# Altium footprint library eLIB.PcbLib: 206 footprints (part 12 of 13) (continued)
## Unalink Logo [mm] (continued)
; -1.187,3.507 1.709,3.507 ; -1.187,3.533 1.709,3.533 ; -1.161,-6.475 -0.882,-6.475 ; -1.161,-2.843 1.734,-2.843 ; -1.161,-2.817 1.734,-2.817 ; -1.161,3.558 1.734,3.558 ; -1.161,3.584 1.734,3.584 ; -1.136,-6.551 -0.857,-6.551 ; -1.136,-6.526 -0.882,-6.526 ; -1.136,-6.5 -0.882,-6.5 ; -1.136,-2.792 1.76,-2.792 ; -1.136,-2.766 1.76,-2.766 ; -1.136,3.609 1.76,3.609 ; -1.136,3.634 1.76,3.634 ; -1.111,-6.627 -0.831,-6.627 ; -1.111,-6.602 -0.857,-6.602 ; -1.111,-6.576 -0.857,-6.576 ; -1.111,-2.741 1.785,-2.741 ; -1.111,-2.716 1.785,-2.716 ; -1.111,3.66 1.785,3.66 ; -1.111,3.685 1.785,3.685 ; -1.085,-6.703 -0.806,-6.703 ; -1.085,-6.678 -0.806,-6.678 ; -1.085,-6.653 -0.831,-6.653 ; -1.085,-2.69 1.81,-2.69 ; -1.085,-2.665 1.81,-2.665 ; -1.085,3.711 1.81,3.711 ; -1.085,3.736 1.81,3.736 ; -1.06,-6.78 -0.78,-6.78 ; -1.06,-6.754 -0.78,-6.754 ; -1.06,-6.729 -0.806,-6.729 ; -1.06,-2.639 1.836,-2.639 ; -1.06,-2.614 1.836,-2.614 ; -1.06,3.761 1.836,3.761 ; -1.06,3.787 1.836,3.787 ; -1.034,-6.805 -0.78,-6.805 ; -1.034,-2.589 1.861,-2.589 ; -1.034,-2.563 1.861,-2.563 ; -1.034,3.812 1.861,3.812 ; -1.034,3.838 1.861,3.838 ; -1.009,-2.538 1.887,-2.538 ; -1.009,-2.512 1.887,-2.512 ; -1.009,3.863 1.887,3.863 ; -1.009,3.888 1.887,3.888 ; -0.984,-2.487 1.912,-2.487 ; -0.984,-2.462 1.912,-2.462 ; -0.984,3.914 1.912,3.914 ; -0.984,3.939 1.912,3.939 ; -0.958,-2.436 1.937,-2.436 ; -0.958,-2.411 1.937,-2.411 ; -0.933,-2.385 1.963,-2.385 ; -0.933,-2.36 1.963,-2.36 ; -0.907,-2.335 1.988,-2.335 ; -0.907,-2.309 1.988,-2.309 ; -0.882,-2.284 2.014,-2.284 ; -0.882,-2.258 2.014,-2.258 ; -0.857,-2.233 2.039,-2.233 ; -0.857,-2.208 2.039,-2.208 ; -0.831,-2.182 2.064,-2.182 ; -0.831,-2.157 2.064,-2.157 ; -0.806,-2.131 2.09,-2.131 ; -0.806,-2.106 2.09,-2.106 ; -0.78,-2.081 2.115,-2.081 ; -0.78,-2.055 2.115,-2.055 ; -0.755,-2.03 2.141,-2.03 ; -0.755,-2.004 2.141,-2.004 ; -0.73,-1.979 2.166,-1.979 ; -0.73,-1.954 2.166,-1.954 ; -0.704,-1.928 2.191,-1.928 ; -0.704,-1.903 2.191,-1.903 ; -0.679,-1.877 2.217,-1.877 ; -0.679,-1.852 2.217,-1.852 ; -0.653,-1.827 2.242,-1.827 ; -0.653,-1.801 2.242,-1.801 ; -0.628,-1.776 2.268,-1.776 ; -0.628,-1.75 2.268,-1.75 ; -0.603,-1.725 2.293,-1.725 ; -0.603,-1.7 2.293,-1.7 ; -0.577,-1.674 2.318,-1.674 ; -0.577,-1.649 2.318,-1.649 ; -0.552,-1.623 2.344,-1.623 ; -0.552,-1.598 2.344,-1.598 ; -0.526,-1.573 2.369,-1.573 ; -0.526,-1.547 2.369,-1.547 ; -0.501,-1.522 2.395,-1.522 ; -0.501,-1.496 2.395,-1.496 ; -0.476,-1.471 2.42,-1.471 ; -0.476,-1.446 2.42,-1.446 ; -0.45,-1.42 2.445,-1.42 ; -0.45,-1.395 2.445,-1.395 ; -0.425,-1.369 2.445,-1.369 ; -0.425,-1.344 2.471,-1.344 ; -0.399,-1.319 2.471,-1.319 ; -0.399,-1.293 2.496,-1.293 ; -0.374,-6.805 0.49,-6.805 ; -0.374,-6.78 0.49,-6.78 ; -0.374,-6.754 0.49,-6.754 ; -0.374,-6.729 0.49,-6.729 ; -0.374,-6.703 0.49,-6.703 ; -0.374,-6.678 0.49,-6.678 ; -0.374,-6.653 0.49,-6.653 ; -0.374,-6.627 0.49,-6.627 ; -0.374,-6.602 -0.12,-6.602 ; -0.374,-6.576 -0.12,-6.576 ; -0.374,-6.551 -0.12,-6.551 ; -0.374,-6.526 -0.12,-6.526 ; -0.374,-6.5 -0.12,-6.5 ; -0.374,-6.475 -0.12,-6.475 ; -0.374,-6.449 -0.12,-6.449 ; -0.374,-6.424 -0.12,-6.424 ; -0.374,-6.399 -0.12,-6.399 ; -0.374,-6.373 -0.12,-6.373 ; -0.374,-6.348 -0.12,-6.348 ; -0.374,-6.322 -0.12,-6.322 ; -0.374,-6.297 -0.12,-6.297 ; -0.374,-6.272 -0.12,-6.272 ; -0.374,-6.246 -0.12,-6.246 ; -0.374,-6.221 -0.12,-6.221 ; -0.374,-6.195 -0.12,-6.195 ; -0.374,-6.17 -0.12,-6.17 ; -0.374,-6.145 -0.12,-6.145 ; -0.374,-6.119 -0.12,-6.119 ; -0.374,-6.094 -0.12,-6.094 ; -0.374,-6.068 -0.12,-6.068 ; -0.374,-6.043 -0.12,-6.043 ; -0.374,-6.018 -0.12,-6.018 ; -0.374,-5.992 -0.12,-5.992 ; -0.374,-5.967 -0.12,-5.967 ; -0.374,-5.941 -0.12,-5.941 ; -0.374,-5.916 -0.12,-5.916 ; -0.374,-5.891 -0.12,-5.891 ; -0.374,-5.865 -0.12,-5.865 ; -0.374,-5.84 -0.12,-5.84 ; -0.374,-5.814 -0.12,-5.814 ; -0.374,-5.789 -0.12,-5.789 ; -0.374,-5.764 -0.12,-5.764 ; -0.374,-5.738 -0.12,-5.738 ; -0.374,-5.713 -0.12,-5.713 ; -0.374,-5.687 -0.12,-5.687 ; -0.374,-5.662 -0.12,-5.662 ; -0.374,-5.637 -0.12,-5.637 ; -0.374,-1.268 2.496,-1.268 ; -0.374,-1.242 2.522,-1.242 ; -0.349,-1.217 2.522,-1.217 ; -0.349,-1.192 2.547,-1.192 ; -0.323,-1.166 2.547,-1.166 ; -0.323,-1.141 2.572,-1.141 ; -0.298,-1.115 2.572,-1.115 ; -0.298,-1.09 2.598,-1.09 ; -0.272,-1.065 2.598,-1.065 ; -0.272,-1.039 2.623,-1.039 ; -0.247,-1.014 2.623,-1.014 ; -0.247,-0.988 2.649,-0.988 ; -0.222,-0.963 2.649,-0.963 ; -0.222,-0.938 2.674,-0.938 ; -0.196,-0.912 2.674,-0.912 ; -0.196,-0.887 2.699,-0.887 ; -0.171,-0.861 2.699,-0.861 ; -0.171,-0.836 2.725,-0.836 ; -0.145,-0.811 2.725,-0.811 ; -0.145,-0.785 2.75,-0.785 ; -0.12,-0.76 2.75,-0.76 ; -0.12,-0.734 2.776,-0.734 ; -0.095,-0.709 2.776,-0.709 ; -0.095,-0.684 2.801,-0.684 ; -0.069,-0.658 2.801,-0.658 ; -0.069,-0.633 2.826,-0.633 ; -0.044,-0.607 2.826,-0.607 ; -0.044,-0.582 2.852,-0.582 ; -0.018,-0.557 2.852,-0.557 ; -0.018,-0.531 2.877,-0.531 ; 0.007,-0.506 2.877,-0.506 ; 0.007,-0.48 2.903,-0.48 ; 0.032,-0.455 2.903,-0.455 ; 0.032,-0.43 2.928,-0.43 ; 0.058,-0.404 2.928,-0.404 ; 0.058,-0.379 2.953,-0.379 ; 0.083,-0.353 2.953,-0.353 ; 0.083,-0.328 2.979,-0.328 ; 0.109,-0.303 2.979,-0.303 ; 0.109,-0.277 3.004,-0.277 ; 0.134,-0.252 3.004,-0.252 ; 0.134,-0.226 3.03,-0.226 ; 0.159,-0.201 3.03,-0.201 ; 0.159,-0.176 3.055,-0.176 ; 0.185,-0.15 3.055,-0.15 ; 0.185,-0.125 3.08,-0.125 ; 0.21,-0.099 3.08,-0.099 ; 0.21,-0.074 3.106,-0.074 ; 0.236,-0.049 3.106,-0.049 ; 0.236,-0.023 3.131,-0.023 ; 0.261,0.002 3.131,0.002 ; 0.261,0.028 3.157,0.028 ; 0.286,0.053 3.157,0.053 ; 0.286,0.078 3.182,0.078 ; 0.312,0.104 3.182,0.104 ; 0.312,0.129 3.207,0.129 ; 0.337,0.155 3.207,0.155 ; 0.337,0.18 3.233,0.18 ; 0.363,0.205 3.233,0.205 ; 0.363,0.231 3.258,0.231 ; 0.388,0.256 3.258,0.256 ; 0.388,0.282 3.284,0.282 ; 0.413,0.307 3.284,0.307 ; 0.413,0.332 3.309,0.332 ; 0.439,0.358 3.309,0.358 ; 0.439,0.383 3.334,0.383 ; 0.464,0.409 3.334,0.409 ; 0.464,0.434 3.36,0.434 ; 0.49,0.459 3.36,0.459 ; 0.49,0.485 3.385,0.485 ; 0.515,0.51 3.385,0.51 ; 0.515,0.536 3.411,0.536 ; 0.54,0.561 3.411,0.561 ; 0.54,0.586 3.436,0.586 ; 0.566,0.612 3.436,0.612 ; 0.566,0.637 3.461,0.637 ; 0.591,0.663 3.461,0.663 ; 0.591,0.688 3.487,0.688 ; 0.617,0.713 3.487,0.713 ; 0.617,0.739 3.512,0.739 ; 0.642,0.764 3.512,0.764 ; 0.642,0.79 3.538,0.79 ; 0.667,0.815 3.538,0.815 ; 0.667,0.84 3.563,0.84 ; 0.693,0.866 3.563,0.866 ; 0.693,0.891 3.588,0.891 ; 0.718,0.917 3.588,0.917 ; 0.718,0.942 3.614,0.942 ; 0.744,0.967 3.614,0.967 ; 0.744,0.993 3.639,0.993 ; 0.769,1.018 3.639,1.018 ; 0.769,1.044 3.665,1.044 ; 0.794,1.069 3.665,1.069 ; 0.794,1.094 3.69,1.094 ; 0.82,1.12 3.69,1.12 ; 0.82,1.145 3.715,1.145 ; 0.845,1.171 3.715,1.171 ; 0.845,1.196 3.741,1.196 ; 0.871,1.221 3.741,1.221 ; 0.871,1.247 3.766,1.247 ; 0.896,1.272 3.766,1.272 ; 0.896,1.298 3.792,1.298 ; 0.921,1.323 3.792,1.323 ; 0.921,1.348 3.817,1.348 ; 0.947,-6.805 1.201,-6.805 ; 0.947,-6.78 1.201,-6.78 ; 0.947,-6.754 1.201,-6.754 ; 0.947,-6.729 1.201,-6.729 ; 0.947,-6.703 1.201,-6.703 ; 0.947,-6.678 1.201,-6.678 ; 0.947,-6.653 1.201,-6.653 ; 0.947,-6.627 1.201,-6.627 ; 0.947,-6.602 1.201,-6.602 ; 0.947,-6.576 1.201,-6.576 ; 0.947,-6.551 1.201,-6.551 ; 0.947,-6.526 1.201,-6.526 ; 0.947,-6.5 1.201,-6.5 ; 0.947,-6.475 1.201,-6.475 ; 0.947,-6.449 1.201,-6.449 ; 0.947,-6.424 1.201,-6.424 ; 0.947,-6.399 1.201,-6.399 ; 0.947,-6.373 1.201,-6.373 ; 0.947,-6.348 1.201,-6.348 ; 0.947,-6.322 1.201,-6.322 ; 0.947,-6.297 1.201,-6.297 ; 0.947,-6.272 1.201,-6.272 ; 0.947,-6.246 1.201,-6.246 ; 0.947,-6.221 1.201,-6.221 ; 0.947,-6.195 1.201,-6.195 ; 0.947,-6.17 1.201,-6.17 ; 0.947,-6.145 1.201,-6.145 ; 0.947,-6.119 1.201,-6.119 ; 0.947,-6.094 1.201,-6.094 ; 0.947,-6.068 1.201,-6.068 ; 0.947,-6.043 1.201,-6.043 ; 0.947,-6.018 1.201,-6.018 ; 0.947,-5.992 1.201,-5.992 ; 0.947,-5.967 1.201,-5.967 ; 0.947,-5.941 1.201,-5.941 ; 0.947,-5.916 1.201,-5.916 ; 0.947,-5.891 1.201,-5.891 ; 0.947,-5.865 1.201,-5.865 ; 0.947,-5.84 1.201,-5.84 ; 0.947,-5.814 1.201,-5.814 ; 0.947,-5.789 1.201,-5.789 ; 0.947,-5.764 1.201,-5.764 ; 0.947,-5.738 1.201,-5.738 ; 0.947,-5.713 1.201,-5.713 ; 0.947,-5.687 1.201,-5.687 ; 0.947,-5.662 1.201,-5.662 ; 0.947,-5.637 1.201,-5.637 ; 0.947,1.374 3.817,1.374 ; 0.947,1.399 3.842,1.399 ; 0.972,1.425 3.842,1.425 ; 0.972,1.45 3.868,1.45 ; 0.998,1.475 3.868,1.475 ; 0.998,1.501 3.893,1.501 ; 1.023,1.526 3.893,1.526 ; 1.023,1.552 3.919,1.552 ; 1.048,1.577 3.919,1.577 ; 1.048,1.602 3.944,1.602 ; 1.074,1.628 3.944,1.628 ; 1.074,1.653 3.969,1.653 ; 1.099,1.679 3.969,1.679 ; 1.099,1.704 3.995,1.704 ; 1.125,1.729 3.995,1.729 ; 1.125,1.755 4.02,1.755 ; 1.15,1.78 4.02,1.78 ; 1.15,1.806 4.046,1.806 ; 1.175,1.831 4.046,1.831 ; 1.175,1.856 4.071,1.856 ; 1.201,1.882 4.071,1.882 ; 1.201,1.907 4.096,1.907 ; 1.226,1.933 4.096,1.933 ; 1.226,1.958 4.122,1.958 ; 1.252,1.983 4.122,1.983 ; 1.252,2.009 4.147,2.009 ; 1.277,2.034 4.147,2.034 ; 1.277,2.06 4.173,2.06 ; 1.302,2.085 4.173,2.085 ; 1.302,2.11 4.198,2.11 ; 1.328,2.136 4.198,2.136 ; 1.328,2.161 4.223,2.161 ; 1.353,2.187 4.223,2.187 ; 1.353,2.212 4.249,2.212 ; 1.379,2.237 4.249,2.237 ; 1.379,2.263 4.274,2.263 ; 1.404,2.288 4.274,2.288 ; 1.404,2.314 4.3,2.314 ; 1.429,2.339 4.3,2.339 ; 1.429,2.364 4.325,2.364 ; 1.455,2.39 4.325,2.39 ; 1.455,2.415 4.35,2.415 ; 1.48,2.441 4.35,2.441 ; 1.48,2.466 4.376,2.466 ; 1.506,2.491 4.376,2.491 ; 1.506,2.517 4.401,2.517 ; 1.531,2.542 4.401,2.542 ; 1.531,2.568 4.427,2.568 ; 1.556,2.593 4.427,2.593 ; 1.556,2.618 4.452,2.618 ; 1.582,2.644 4.452,2.644 ; 1.582,2.669 4.477,2.669 ; 1.607,2.695 4.477,2.695 ; 1.607,2.72 4.503,2.72 ; 1.633,2.745 4.503,2.745 ; 1.633,2.771 4.528,2.771 ; 1.658,2.796 4.528,2.796 ; 1.658,2.822 4.554,2.822 ; 1.683,2.847 4.554,2.847 ; 1.683,2.872 4.579,2.872 ; 1.709,-6.805 1.963,-6.805 ; 1.709,-6.78 1.963,-6.78 ; 1.709,-6.754 1.963,-6.754 ; 1.709,-6.729 1.963,-6.729 ; 1.709,-6.703 1.963,-6.703 ; 1.709,-6.678 1.963,-6.678 ; 1.709,-6.653 1.963,-6.653 ; 1.709,-6.627 1.963,-6.627 ; 1.709,-6.602 1.963,-6.602 ; 1.709,-6.576 1.963,-6.576 ; 1.709,-6.551 1.963,-6.551 ; 1.709,-6.526 1.963,-6.526 ; 1.709,-6.5 1.963,-6.5 ; 1.709,-6.475 1.963,-6.475 ; 1.709,-6.449 1.963,-6.449 ; 1.709,-6.424 1.963,-6.424 ; 1.709,-6.399 1.963,-6.399 ; 1.709,-6.373 1.963,-6.373 ; 1.709,-6.348 1.963,-6.348 ; 1.709,-6.322 1.963,-6.322 ; 1.709,-6.297 1.963,-6.297 ; 1.709,-6.272 1.963,-6.272 ; 1.709,-6.246 1.963,-6.246 ; 1.709,-6.221 1.963,-6.221 ; 1.709,-6.195 1.963,-6.195 ; 1.709,-6.17 1.963,-6.17 ; 1.709,-6.145 1.963,-6.145 ; 1.709,-6.119 1.963,-6.119 ; 1.709,-6.094 1.963,-6.094 ; 1.709,-6.068 1.937,-6.068 ; 1.709,-6.043 1.937,-6.043 ; 1.709,-6.018 1.937,-6.018 ; 1.709,-5.992 1.937,-5.992 ; 1.709,-5.967 1.937,-5.967 ; 1.709,-5.941 2.191,-5.941 ; 1.709,-5.916 2.191,-5.916 ; 1.709,-5.891 2.166,-5.891 ; 1.709,-5.865 2.166,-5.865 ; 1.709,-5.84 2.141,-5.84 ; 1.709,-5.814 2.141,-5.814 ; 1.709,-5.789 2.115,-5.789 ; 1.709,-5.764 2.115,-5.764 ; 1.709,-5.738 2.09,-5.738 ; 1.709,-5.713 2.09,-5.713 ; 1.709,-5.687 2.064,-5.687 ; 1.709,-5.662 2.039,-5.662 ; 1.709,-5.637 2.039,-5.637 ; 1.709,2.898 4.579,2.898 ; 1.709,2.923 4.604,2.923 ; 1.734,2.949 4.604,2.949 ; 1.734,2.974 4.63,2.974 ; 1.76,2.999 4.63,2.999 ; 1.76,3.025 4.655,3.025 ; 1.785,3.05 4.655,3.05 ; 1.785,3.076 4.681,3.076 ; 1.81,3.101 4.681,3.101 ; 1.81,3.126 4.706,3.126 ; 1.836,3.152 4.706,3.152 ; 1.836,3.177 4.731,3.177 ; 1.861,3.203 4.731,3.203 ; 1.861,3.228 4.757,3.228 ; 1.887,3.253 4.757,3.253 ; 1.887,3.279 4.782,3.279 ; 1.912,3.304 4.782,3.304 ; 1.912,3.33 4.808,3.33 ; 1.937,3.355 4.808,3.355 ; 1.937,3.38 4.833,3.38 ; 1.963,-5.992 2.217,-5.992 ; 1.963,-5.967 2.217,-5.967 ; 1.963,3.406 4.833,3.406 ; 1.963,3.431 4.858,3.431 ; 1.988,-6.043 2.268,-6.043 ; 1.988,-6.018 2.242,-6.018 ; 1.988,3.457 4.858,3.457 ; 1.988,3.482 4.884,3.482 ; 2.014,-6.068 2.268,-6.068 ; 2.014,3.507 4.884,3.507 ; 2.014,3.533 4.909,3.533 ; 2.039,-6.119 2.293,-6.119 ; 2.039,-6.094 2.293,-6.094 ; 2.039,3.558 4.909,3.558 ; 2.039,3.584 4.935,3.584 ; 2.064,-6.17 2.318,-6.17 ; 2.064,-6.145 2.318,-6.145 ; 2.064,3.609 4.935,3.609 ; 2.064,3.634 4.96,3.634 ; 2.09,-6.221 2.344,-6.221 ; 2.09,-6.195 2.344,-6.195 ; 2.09,3.66 4.96,3.66 ; 2.09,3.685 4.985,3.685 ; 2.115,-6.272 2.369,-6.272 ; 2.115,-6.246 2.369,-6.246 ; 2.115,3.711 4.985,3.711 ; 2.115,3.736 5.011,3.736 ; 2.141,-6.322 2.42,-6.322 ; 2.141,-6.297 2.395,-6.297 ; 2.141,3.761 5.011,3.761 ; 2.141,3.787 5.036,3.787 ; 2.141,3.812 5.036,3.812 ; 2.166,-6.373 2.445,-6.373 ; 2.166,-6.348 2.42,-6.348 ; 2.166,3.838 5.062,3.838 ; 2.166,3.863 5.062,3.863 ; 2.191,-6.399 2.445,-6.399 ; 2.191,3.888 5.087,3.888 ; 2.191,3.914 5.087,3.914 ; 2.217,-6.449 2.471,-6.449 ; 2.217,-6.424 2.471,-6.424 ; 2.217,3.939 5.112,3.939 ; 2.242,-6.5 2.496,-6.5 ; 2.242,-6.475 2.496,-6.475 ; 2.268,-6.551 2.75,-6.551 ; 2.268,-6.526 2.75,-6.526 ; 2.293,-6.602 2.75,-6.602 ; 2.293,-6.576 2.75,-6.576 ; 2.318,-6.653 2.75,-6.653 ; 2.318,-6.627 2.75,-6.627 ; 2.344,-6.678 2.75,-6.678 ; 2.369,-6.729 2.75,-6.729 ; 2.369,-6.703 2.75,-6.703 ; 2.395,-6.78 2.75,-6.78 ; 2.395,-6.754 2.75,-6.754 ; 2.42,-6.805 2.75,-6.805 ; 2.496,-6.373 2.75,-6.373 ; 2.496,-6.348 2.75,-6.348 ; 2.496,-6.322 2.75,-6.322 ; 2.496,-6.297 2.75,-6.297 ; 2.496,-6.272 2.75,-6.272 ; 2.496,-6.246 2.75,-6.246 ; 2.496,-6.221 2.75,-6.221 ; 2.496,-6.195 2.75,-6.195 ; 2.496,-6.17 2.75,-6.17 ; 2.496,-6.145 2.75,-6.145 ; 2.496,-6.119 2.75,-6.119 ; 2.496,-6.094 2.75,-6.094 ; 2.496,-6.068 2.75,-6.068 ; 2.496,-6.043 2.75,-6.043 ; 2.496,-6.018 2.75,-6.018 ; 2.496,-5.992 2.75,-5.992 ; 2.496,-5.967 2.75,-5.967 ; 2.496,-5.941 2.75,-5.941 ; 2.496,-5.916 2.75,-5.916 ; 2.496,-5.891 2.75,-5.891 ; 2.496,-5.865 2.75,-5.865 ; 2.496,-5.84 2.75,-5.84 ; 2.496,-5.814 2.75,-5.814 ; 2.496,-5.789 2.75,-5.789 ; 2.496,-5.764 2.75,-5.764 ; 2.496,-5.738 2.75,-5.738 ; 2.496,-5.713 2.75,-5.713 ; 2.496,-5.687 2.75,-5.687 ; 2.496,-5.662 2.75,-5.662 ; 2.496,-5.637 2.75,-5.637 ; 2.522,-6.5 2.75,-6.5 ; 2.522,-6.475 2.75,-6.475 ; 2.522,-6.449 2.75,-6.449 ; 2.522,-6.424 2.75,-6.424 ; 2.522,-6.399 2.75,-6.399 ; 3.284,-6.805 3.538,-6.805 ; 3.284,-6.78 3.538,-6.78 ; 3.284,-6.754 3.538,-6.754 ; 3.284,-6.729 3.538,-6.729 ; 3.284,-6.703 3.538,-6.703 ; 3.284,-6.678 3.538,-6.678 ; 3.284,-6.653 3.538,-6.653 ; 3.284,-6.627 3.538,-6.627 ; 3.284,-6.602 3.538,-6.602 ; 3.284,-6.576 3.538,-6.576 ; 3.284,-6.551 3.538,-6.551 ; 3.284,-6.526 3.538,-6.526 ; 3.284,-6.5 3.538,-6.5 ; 3.284,-6.475 3.538,-6.475 ; 3.284,-6.449 3.538,-6.449 ; 3.284,-6.424 3.538,-6.424 ; 3.284,-6.399 3.563,-6.399 ; 3.284,-6.373 3.588,-6.373 ; 3.284,-6.348 3.919,-6.348 ; 3.284,-6.322 3.893,-6.322 ; 3.284,-6.297 3.868,-6.297 ; 3.284,-6.272 3.868,-6.272 ; 3.284,-6.246 3.842,-6.246 ; 3.284,-6.221 3.817,-6.221 ; 3.284,-6.195 3.792,-6.195 ; 3.284,-6.17 3.817,-6.17 ; 3.284,-6.145 3.538,-6.145 ; 3.284,-6.119 3.538,-6.119 ; 3.284,-6.094 3.538,-6.094 ; 3.284,-6.068 3.538,-6.068 ; 3.284,-6.043 3.538,-6.043 ; 3.284,-6.018 3.538,-6.018 ; 3.284,-5.992 3.538,-5.992 ; 3.284,-5.967 3.538,-5.967 ; 3.284,-5.941 3.538,-5.941 ; 3.284,-5.916 3.538,-5.916 ; 3.284,-5.891 3.538,-5.891 ; 3.284,-5.865 3.538,-5.865 ; 3.284,-5.84 3.538,-5.84 ; 3.284,-5.814 3.538,-5.814 ; 3.284,-5.789 3.538,-5.789 ; 3.284,-5.764 3.538,-5.764 ; 3.284,-5.738 3.538,-5.738 ; 3.284,-5.713 3.538,-5.713 ; 3.284,-5.687 3.538,-5.687 ; 3.284,-5.662 3.538,-5.662 ; 3.284,-5.637 3.538,-5.637 ; 3.563,-6.145 3.842,-6.145 ; 3.588,-6.119 3.868,-6.119 ; 3.614,-6.094 3.893,-6.094 ; 3.639,-6.373 3.944,-6.373 ; 3.639,-6.068 3.919,-6.068 ; 3.639,-6.043 3.944,-6.043 ; 3.665,-6.424 3.969,-6.424 ; 3.665,-6.399 3.969,-6.399 ; 3.665,-6.018 3.969,-6.018 ; 3.69,-6.449 3.995,-6.449 ; 3.69,-5.992 3.969,-5.992 ; 3.715,-6.475 4.02,-6.475 ; 3.715,-5.967 3.995,-5.967 ; 3.741,-6.526 4.071,-6.526 ; 3.741,-6.5 4.046,-6.5 ; 3.741,-5.941 4.02,-5.941 ; 3.766,-6.551 4.071,-6.551 ; 3.766,-5.916 4.046,-5.916 ; 3.792,-6.576 4.096,-6.576 ; 3.792,-5.891 4.071,-5.891 ; 3.817,-6.602 4.122,-6.602 ; 3.817,-5.865 4.096,-5.865 ; 3.842,-6.653 4.173,-6.653 ; 3.842,-6.627 4.147,-6.627 ; 3.842,-5.84 4.122,-5.84 ; 3.868,-6.678 4.173,-6.678 ; 3.868,-5.814 4.147,-5.814 ; 3.868,-5.789 4.173,-5.789 ; 3.893,-6.703 4.198,-6.703 ; 3.893,-5.764 4.198,-5.764 ; 3.919,-6.754 4.249,-6.754 ; 3.919,-6.729 4.223,-6.729 ; 3.919,-5.738 4.223,-5.738 ; 3.944,-6.78 4.274,-6.78 ; 3.944,-5.713 4.249,-5.713 ; 3.969,-6.805 4.3,-6.805 ; 3.969,-5.687 4.274,-5.687 ; 3.995,-5.662 4.274,-5.662 ; 4.02,-5.637 4.3,-5.637 ; 5.112,-6.78 5.163,-6.78 ; 5.112,-6.754 5.214,-6.754 ; 5.112,-6.729 5.265,-6.729 ; 5.112,-6.703 5.316,-6.703 ; 5.112,-6.678 5.366,-6.678 ; 5.112,-6.653 5.417,-6.653 ; 5.112,-6.627 5.468,-6.627 ; 5.112,-6.602 5.519,-6.602 ; 5.112,-6.576 5.57,-6.576 ; 5.112,-6.551 5.62,-6.551 ; 5.112,-6.526 5.671,-6.526 ; 5.112,-6.5 5.722,-6.5 ; 5.112,-6.475 5.773,-6.475 ; 5.112,-6.449 5.824,-6.449 ; 5.112,-6.424 5.874,-6.424 ; 5.112,-6.399 5.925,-6.399 ; 5.112,-6.373 5.976,-6.373 ; 5.112,-6.348 6.027,-6.348 ; 5.112,-6.322 6.078,-6.322 ; 5.112,-6.297 6.128,-6.297 ; 5.112,-6.272 6.154,-6.272 ; 5.112,-6.246 6.128,-6.246 ; 5.112,-6.221 6.078,-6.221 ; 5.112,-6.195 6.027,-6.195 ; 5.112,-6.17 5.976,-6.17 ; 5.112,-6.145 5.925,-6.145 ; 5.112,-6.119 5.874,-6.119 ; 5.112,-6.094 5.824,-6.094 ; 5.112,-6.068 5.773,-6.068 ; 5.112,-6.043 5.722,-6.043 ; 5.112,-6.018 5.671,-6.018 ; 5.112,-5.992 5.62,-5.992 ; 5.112,-5.967 5.57,-5.967 ; 5.112,-5.941 5.519,-5.941 ; 5.112,-5.916 5.468,-5.916 ; 5.112,-5.891 5.417,-5.891 ; 5.112,-5.865 5.366,-5.865 ; 5.112,-5.84 5.316,-5.84 ; 5.112,-5.814 5.265,-5.814 ; 5.112,-5.789 5.214,-5.789 ; 5.112,-5.764 5.163,-5.764

## USB 2.0 Plug [mm] "USB 2.0 Plug Type A SMT with Clip"
height 19.8
pads (6):
  rect 1.3x1.7 smd: 1(3.5,10.2) 2(1,10.2) 3(-1,10.2) 4(-3.5,10.2)
  round 2.8 hole 1.9: Shell(-2.25,7.85) Shell(2.25,7.85)
Top Assembly:
  lines w0.1: -6,5.6 6,5.6
  text "PCB Edge" at -2,4.55 h0.61
Mechanical 13:
  lines w0.1: -4.05,9.4 -4.05,10.4 -2.95,10.4 -2.95,9.4 ; -1.55,9.4 -1.55,10.4 -0.45,10.4 -0.45,9.4 ; 0.45,9.4 0.45,10.4 1.55,10.4 1.55,9.4 ; 2.95,9.4 2.95,10.4 4.05,10.4 4.05,9.4 ; -6,-9.4 -6,5.6 -5.05,5.6 -5.05,9.4 5.05,9.4 5.05,5.6 6,5.6 6,-9.4 -6,-9.4
Mechanical 15:
  lines w0.05: -0.5,0 0.5,0 ; 0,-0.5 0,0.5
3D body "629004113921.stp": height 2.25, standoff -2.25, extent -6,-9.4 6,10.4

## USB Right Angle [mm] "Connector; USB1.1, Type A, Thru-Hole; 4 Position; Right Angle"
height 13.83
pads (8):
  rect 1.3x1.8 hole 1: 1(-18.56,0)
  oval 1.3x1.8 hole 1: 2(-16.56,0) 3(-14.56,0) 4(-12.56,0)
  round 2.25 hole 1.35: 5(-19.29,2.72) 6(-19.29,-2.72) 7(-12.29,2.72) 8(-12.29,-2.72)
Top Overlay:
  circle w0.25: c-19.91,0 r0.125
  lines w0.2: -17.773,-2.88 -13.807,-2.88 ; -17.773,2.88 -13.807,2.88 ; -10.773,-2.88 0,-2.88 0,2.88 -10.773,2.88
3D body "USB.STEP": height 14.55, standoff -3.26, extent -19.74,-3.57 -0.04,3.55

## USB TypeB [mm] "USB TypeB Vertical"

## USB-2-B-H [mm] "USB 2.0 Type B Horizontal"
height 11.05
pads (6):
  rect 1.42x1.42 hole 0.92: 1(1.25,6.74)
  round 1.42 hole 0.92: 2(-1.25,6.74) 3(-1.25,4.74) 4(1.25,4.74)
  round 3.45 hole 2.3: Shell(-6.02,2.03) Shell(6.02,2.03)
Top Overlay:
  lines w0.2: -6.02,0.1 -6.02,-8.25 6.02,-8.25 6.02,0.1 ; -6.02,3.96 -6.02,8.25 6.02,8.25 6.02,3.96
Mechanical 13:
  lines w0.2: -7.47,-8.25 7.47,-8.25 7.47,8.25 -7.47,8.25 -7.47,-8.25
3D body "61400416121.stp": height 11.1, standoff -3.76, extent -7.484,-8.25 7.484,8.25

## USB-B [mm] "Mini USB 2.0 Type B SMT Horizontal 5 Contacts"
height 3.9
pads (11):
  rect 0.5x2.7 smd: 1(-1.6,3.875) 2(-0.8,3.875) 3(0,3.875) 4(0.8,3.875) 5(1.6,3.875)
  round 0.9 hole 0.9 unplated: MH1(-2.2,1.275) MH2(2.2,1.275)
  rect 2.1x2.6 smd: Shell(-4.4,-1.625) Shell(-4.4,3.875) Shell(4.4,-1.625)
  rect 2.1x2.7 smd: Shell(4.4,3.875)
Top Overlay:
  lines w0.2: -3.85,-3.175 -3.85,-4.625 3.85,-4.625 3.85,-3.175 ; -3.85,-0.075 -3.85,2.325 ; -3.1,4.625 -2.15,4.625 ; 2.15,4.625 3.1,4.625 ; 3.85,-0.075 3.85,2.325
Mechanical 13:
  lines w0.1: -3.85,-4.625 3.85,-4.625 3.85,4.625 -3.85,4.625 -3.85,-4.625
Mechanical 15:
  lines w0.05: -0.5,0 0.5,0 ; 0,-0.5 0,0.5
3D body "65100516121.stp": height 3.92, standoff -0.98, extent -4.8,-4.625 4.8,4.625

## USB_MICRO_B_BM_SHT2 [mm] "CONN, USB Micro AB - Standard (Bottom mount), Shell SMT"
height 2.8
pads (15):
  oval 0.4x1.4 smd: 1(1.3,0) 2(0.65,0) 3(0,0) 4(-0.65,0) 5(-1.3,0)
  rect 2x1.6 smd: SH1(-3.1,0.1) SH6(3.1,0.1)
  rect 2x2 smd: SH2(-4,2.6) SH3(-1.2,2.6) SH4(1.2,2.6) SH5(4,2.6)
  oval 1.4x1.2 hole 0.8 slot 1 at 0 deg mask+0.05: SH7(-2.5,-0.2) SH8(2.5,-0.2)
  oval 0.8x1.6 hole 0.5 slot 1.2 at 90 deg: SH9(-3.5,2.4) SH10(3.5,2.4)
Top Overlay:
  circle w0.2: c1.7,-1 r0.2
  lines w0.2: -3.8,1.03 -3.8,1.53 ; -3.8,3.73 -3.8,4.791 -4.078,5.192 -3.831,5.363 -3.462,4.83 -3.1,4.83 -3.1,5.23 -2.9,5.43 2.8,5.43 ; -1.9,-0.27 -1.8,-0.27 -1.8,0.23 -1.6,0.23 ; 1.6,0.23 1.8,0.23 1.8,-0.27 1.9,-0.27 ; 2.9,5.43 3.1,5.23 3.1,4.83 3.462,4.83 3.831,5.363 4.078,5.192 3.8,4.791 3.8,3.73 ; 3.8,1.03 3.8,1.53
Mechanical 1:
  lines w0.1: -5,4.092 5,4.092
  text "PCB EDGE" at -2.7,4.4 h0.8
3D body "User Library-MicroUSB-B_Molex_105017-0001.step": height 2.68, standoff -0.63, extent -4.1,-0.45 4.1,4.98